# Altium footprint library TarabusLib_KAP.PcbLib: 504 footprints (part 7 of 32)
Each footprint in its own frame and in the unit in brackets; x right, y up, seen from the top. Pads: shape width x height; smd on the part's side, far side on the other; paste and mask are expansions set on the pad; w line width, h text height; cw(c..) or ccw(c..) is an arc to the next point about the centre after c.
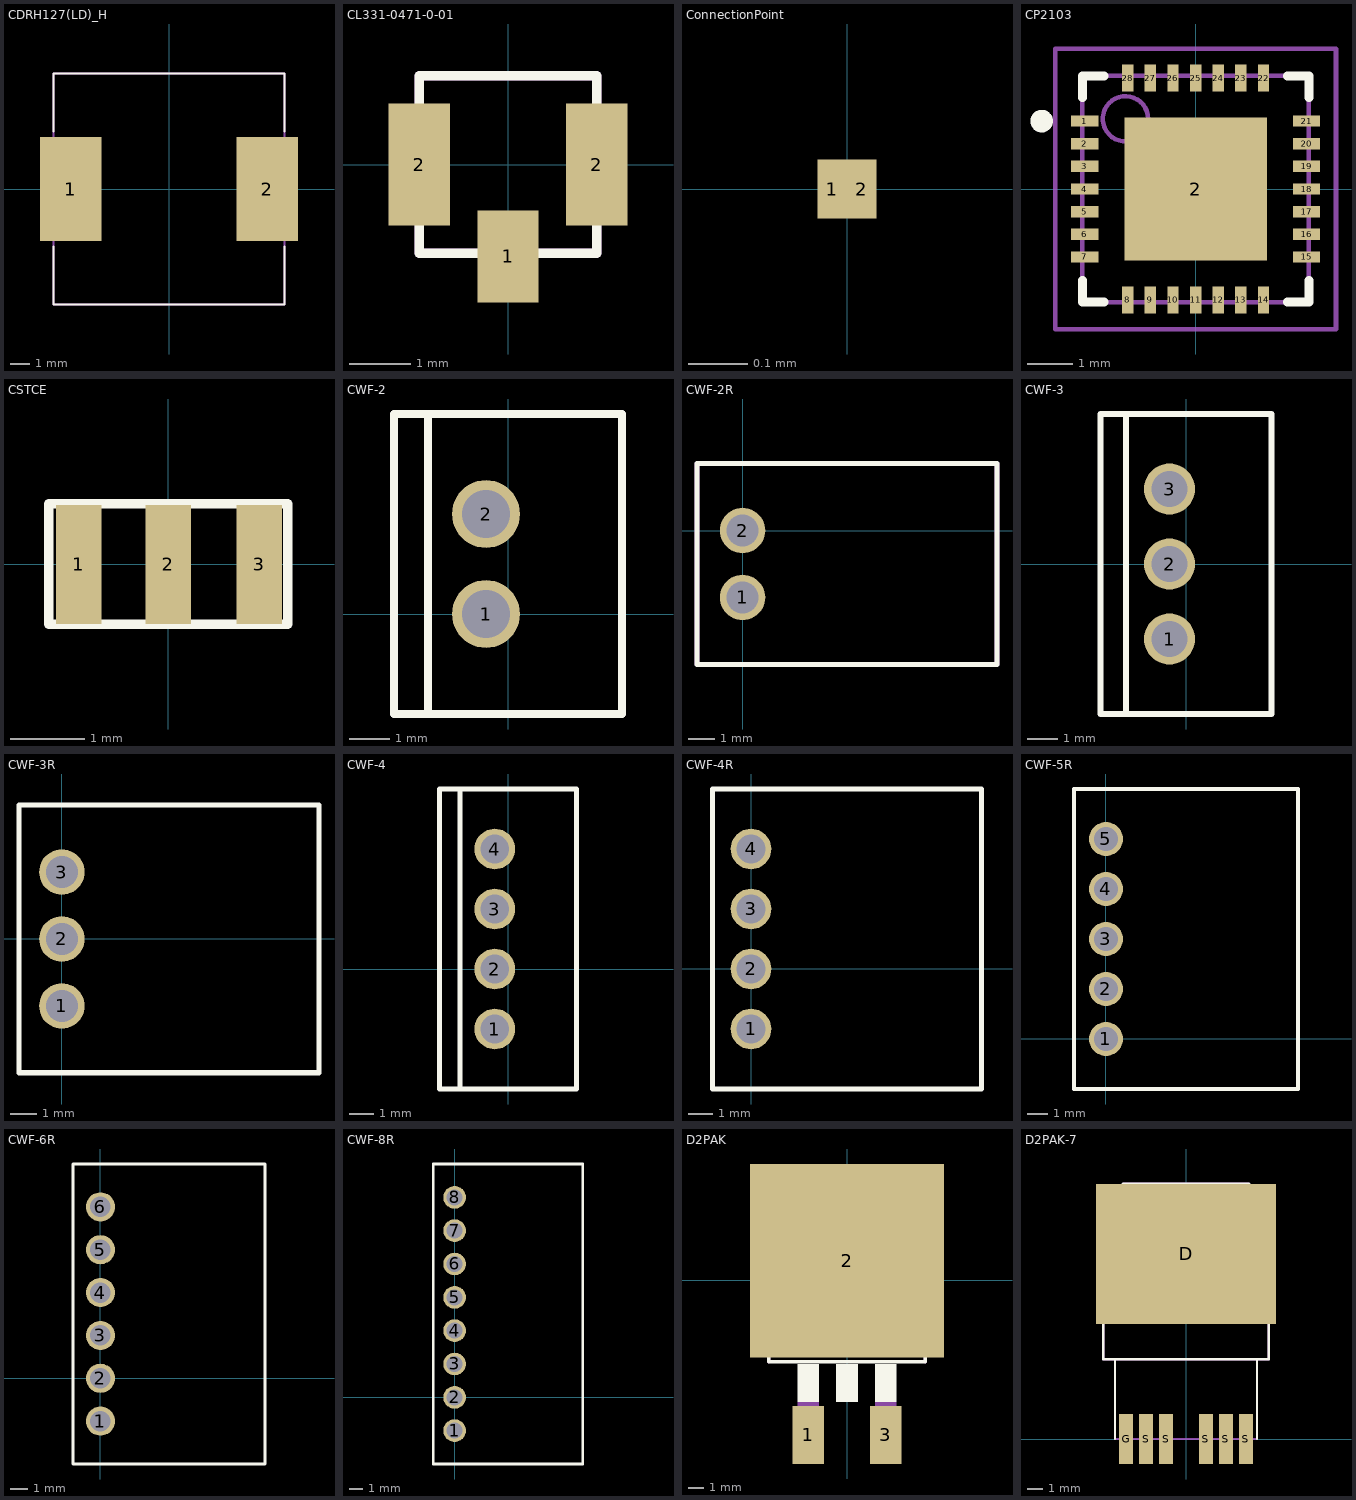
[diagram p6: the footprints below, top view; thin cyan lines are the x and y axes]

## CDRH127(LD)_H [mm]
height 8
pads (2):
  rect 3.2x5.4 smd mask+0: 1(-5.1,0) 2(5.1,0)
Top Overlay:
  lines w0.1: -6,-3 -6,-6 6,-6 6,-3 ; -6,3 -6,6 6,6 6,3
Mechanical 7:
  lines w0.1: -6,-6 -6,4.5 -6,6 6,6 6,-1.5 6,-6 -6,-6
Mechanical 10:
  text ".Comment" at -2,-7 h0.6
  text ".Designator" at 0,7 h0.8
3D body: height 2.8, standoff 0, extent -6,-6 6,6

## CL331-0471-0-01 [mm]
pads (3):
  rect 1x1.5 smd mask+0: 1(0,-1.5)
  rect 1x2 smd mask+0: 2(-1.45,0) 2(1.45,0)
Top Overlay:
  lines w0.15: -0.5,-1.45 -1.45,-1.45 -1.45,1.45 1.45,1.45 1.45,-1.45 0.5,-1.45
Mechanical 7:
  lines w0.15: -0.5,-1.45 -1.45,-1.45 -1.45,1.45 1.45,1.45 1.45,-1.45 0.5,-1.45
3D body "User Library-CL331-0471-0-01.STEP": height 1.3, standoff -0.05, extent -1.45,-1.45 1.45,1.45

## ConnectionPoint [mm]
pads (2):
  rect 0.05x0.1 smd paste+0 mask-0.1: 1(-0.025,0) 2(0.025,0)

## CP2103 [mm] "QFN, 28-Leads, Body 5,0x5,0mm (max), Pitch 0,50mm, IPC Medium Density"
height 1
pads (29):
  rect 0.6x0.25 smd: 1(-2.45,1.5) 2(-2.45,1) 3(-2.45,0.5) 4(-2.45,0) 5(-2.45,-0.5) 6(-2.45,-1) 7(-2.45,-1.5) 15(2.45,-1.5) 16(2.45,-1) 17(2.45,-0.5) 18(2.45,0) 19(2.45,0.5) 20(2.45,1) 21(2.45,1.5)
  rect 3.15x3.15 smd: 2(0,0)
  rect 0.25x0.6 smd: 8(-1.5,-2.45) 9(-1,-2.45) 10(-0.5,-2.45) 11(0,-2.45) 12(0.5,-2.45) 13(1,-2.45) 14(1.5,-2.45) 22(1.5,2.45) 23(1,2.45) 24(0.5,2.45) 25(0,2.45) 26(-0.5,2.45) 27(-1,2.45) 28(-1.5,2.45)
Top Overlay:
  circle w0.25: c-3.4,1.5 r0.125
  lines w0.2: -2.5,-2.025 -2.5,-2.5 -2.025,-2.5 ; -2.5,2.025 -2.5,2.5 -2.025,2.5 ; 2.025,-2.5 2.5,-2.5 2.5,-2.025 ; 2.025,2.5 2.5,2.5 2.5,2.025
Mechanical 13:
  circle w0.1: c-1.55,1.55 r0.5
  lines w0.1: -2.5,-2.5 2.5,-2.5 2.5,2.5 -2.5,2.5 -2.5,-2.5
Mechanical 15:
  lines w0.1: -0.5,0 0.5,0 ; 0,-0.5 0,0.5 ; -3.1,-3.1 3.1,-3.1 3.1,3.1 -3.1,3.1 -3.1,-3.1
3D body: height 1, standoff 0.11, extent -2.5,-2.5 2.5,2.5

## CSTCE [mil]
pads (3):
  rect 24x63 smd: 1(-47.24,0) 2(0,0) 3(48,0)
Top Overlay:
  lines w5: -62.99,-31.5 63,-31.5 63,32 -62.99,32 -62.99,-31.5

## CWF-2 [mm]
pads (2):
  round 1.7 hole 1.2: 1(-0.55,0) 2(-0.55,2.5)
Top Overlay:
  lines w0.2: -2,-2.5 -2,5 ; -2.85,-2.5 2.85,-2.5 2.85,5 -2.85,5 -2.85,-2.5
Mechanical 7:
  lines w0.15: -2,-2.5 -2,5 ; -2.85,-2.5 -2.85,5 2.85,5 2.85,-2.5 -2.85,-2.5
Mechanical 10:
  text ".Comment" at -2.65,6.525 h1
  text ".Designator" at -2.65,5.65 h1
3D body "CWF_2_V.STEP": height 7.7, standoff -1, extent -2.8,-2.45 2.9,5.05

## CWF-2R [mm]
pads (2):
  round 1.7 hole 1.2: 1(0,-2.5) 2(0,0)
Top Overlay:
  lines w0.2: -1.7,-5 -1.7,2.5 9.5,2.5 9.5,-5 -1.7,-5
Mechanical 7:
  lines w0.2: -1.7,-5 9.5,-5 9.5,2.5 -1.7,2.5 -1.7,-5
Mechanical 10:
  text ".Comment" at 0.025,4.6 h1
  text ".Designator" at 0.025,3.65 h1
3D body "CWF_2_H.STEP": height 5.7, standoff -1.5, extent -1.55,-4.975 9.35,2.525

## CWF-3 [mm]
pads (3):
  round 1.7 hole 1.2: 1(-0.55,-2.5) 2(-0.55,0) 3(-0.55,2.5)
Top Overlay:
  lines w0.2: -2,-5 -2,5 ; -2.85,-5 -2.85,5 2.85,5 2.85,-5 -2.85,-5
3D body "CWF_3_V.STEP": height 7.7, standoff -1, extent -2.9,-5 2.8,5

## CWF-3R [mm]
pads (3):
  round 1.7 hole 1.2: 1(0,-2.5) 2(0,0) 3(0,2.5)
Top Overlay:
  lines w0.2: -1.6,-5 -1.6,5 9.6,5 9.6,-5 -1.6,-5
3D body "CWF_3_H.STEP": height 5.7, standoff -1.5, extent -1.5,-5 9.4,5

## CWF-4 [mm]
pads (4):
  round 1.7 hole 1.2: 1(-0.55,-2.5) 2(-0.55,0) 3(-0.55,2.5) 4(-0.55,5)
Top Overlay:
  lines w0.2: -2,-5 -2,7.5 ; -2.85,-5 -2.85,7.5 2.85,7.5 2.85,-5 -2.85,-5
3D body "CWF_4_V.STEP": height 7.7, standoff -1, extent -2.8,-5.05 2.9,7.45

## CWF-4R [mm]
pads (4):
  round 1.7 hole 1.2: 1(0,-2.5) 2(0,0) 3(0,2.5) 4(0,5)
Top Overlay:
  lines w0.2: -1.6,-5 -1.6,7.5 9.6,7.5 9.6,-5 -1.6,-5
3D body "CWF_4_H.STEP": height 1, standoff -6.2, extent -1.5,-5 9.4,7.5

## CWF-5R [mm]
pads (5):
  round 1.7 hole 1.2: 1(0,0) 2(0,2.5) 3(0,5) 4(0,7.5) 5(0,10)
Top Overlay:
  lines w0.2: -1.6,-2.5 9.6,-2.5 9.6,12.5 -1.6,12.5 -1.6,-2.5
3D body "CWF_5_H.STEP": height 5.7, standoff -1.5, extent -1.45,-2.5 9.45,12.5

## CWF-6R [mm]
pads (6):
  round 1.7 hole 1.2: 1(0,-2.5) 2(0,0) 3(0,2.5) 4(0,5) 5(0,7.5) 6(0,10)
Top Overlay:
  lines w0.2: -1.6,-5 -1.6,12.5 9.6,12.5 9.6,-5 -1.6,-5
3D body "CWF_6_H.STEP": height 5.7, standoff -1.5, extent -1.45,-5 9.45,12.5

## CWF-8R [mm]
pads (8):
  round 1.7 hole 1.2: 1(0,-2.5) 2(0,0) 3(0,2.5) 4(0,5) 5(0,7.5) 6(0,10) 7(0,12.5) 8(0,15)
Top Overlay:
  lines w0.2: -1.6,-5 9.6,-5 9.6,17.5 -1.6,17.5 -1.6,-5
3D body "CWF-R-8.STEP": height 5.75, standoff -3.4, extent -2.175,-5.025 9.325,17.475

## D2PAK [mil]
pads (3):
  rect 82x150 smd: 1(-100,-400) 3(100,-400)
  rect 500x500 smd: 2(0,50)
Top Overlay:
  rectangle: -128,-315 -72,-217
  rectangle: 72,-315 128,-217
  rectangle: -28,-315 28,-217
  lines w10: -202,-141 -202,-211 202,-211 202,-141
Mechanical 16:
  rectangle: -122,-425 -78,-369
  rectangle: -128,-371 -72,-315
  rectangle: 78,-425 122,-369
  rectangle: 72,-371 128,-315
  lines w10: -202,-211 -202,125 ; 202,-211 202,125 ; -202,125 -202,135 -133,179 123,179 202,125 ; -202,125 202,125

## D2PAK-7 [mm]
pads (7):
  rect 11.43x8.89 smd: D(0,11.76)
  rect 0.9x3.175 smd: G(-3.81,0) S(-2.54,0) S(-1.27,0) S(1.27,0) S(2.54,0) S(3.81,0)
Top Overlay:
  lines w0.15: -5.25,14.97 -5.25,5.08 5.25,5.08 5.25,14.97 ; -4.51,0 -4.51,5.08 ; 4.51,0 4.51,5.08 ; -5.258,14.97 5.232,14.97 3.962,16.24 -3.988,16.24 -5.258,14.97
Mechanical 7:
  lines w0.15: -5.25,14.97 -5.25,5.08 5.25,5.08 5.25,14.97 ; -4.51,5.08 -4.51,0 4.51,0 4.51,5.08 ; -5.258,14.97 -3.988,16.24 3.962,16.24 5.232,14.97 -5.258,14.97
Mechanical 10:
  text ".Designator" at -1.3,-2.8 h0.7
  text ".Comment" at -1.3,17 h0.7
3D body "User Library-D2PAK-7_4_1.STEP": height 4.5, standoff 0, extent -5.2,-0.069 5.2,15.599